# Altium footprint library PcbLibUltimate (1).pcblib: 202 footprints (part 11 of 13)
Each footprint in its own frame and in the unit in brackets; x right, y up, seen from the top. Pads: shape width x height; smd on the part's side, far side on the other; paste and mask are expansions set on the pad; w line width, h text height; cw(c..) or ccw(c..) is an arc to the next point about the centre after c.
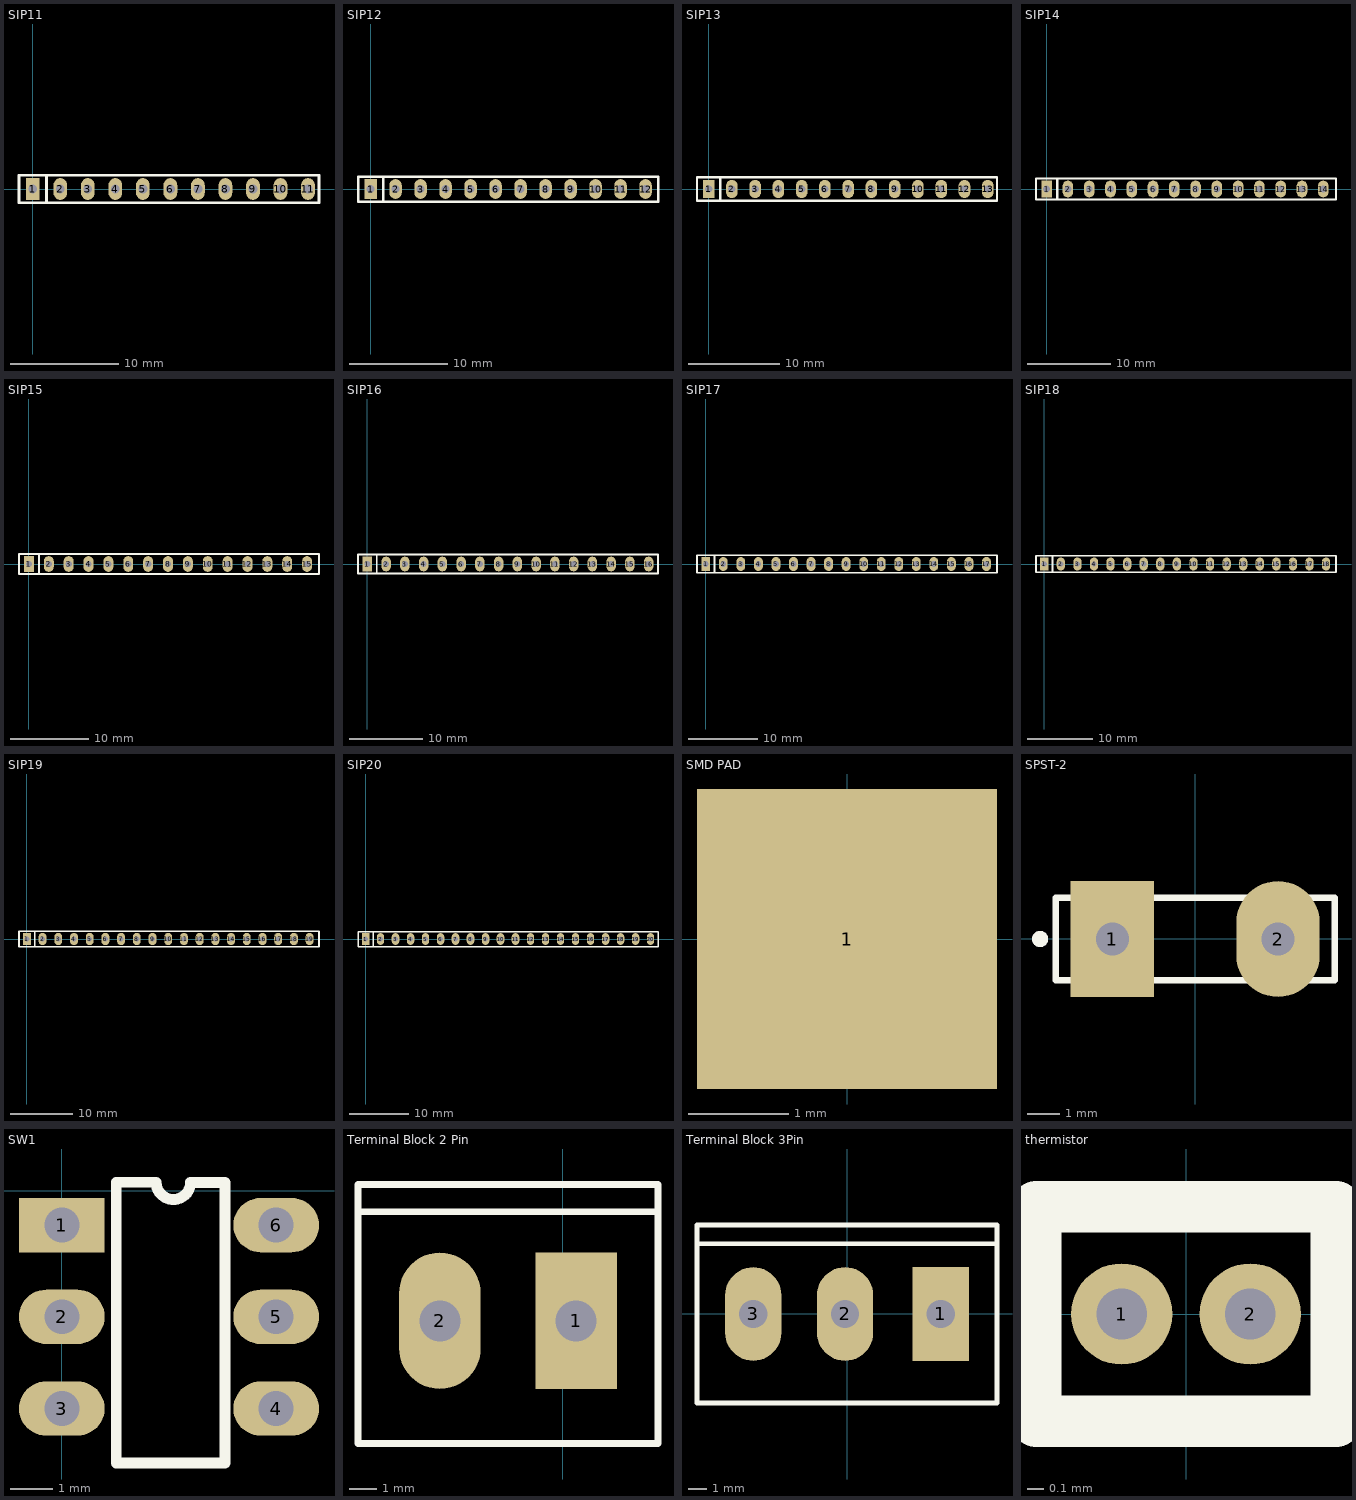
[diagram p10: the footprints below, top view; thin cyan lines are the x and y axes]

## SIP11 [mil]
pads (11):
  rect 50x78.74 hole 32: 1(0,0)
  oval 50x78.74 hole 32: 2(100,0) 3(200,0) 4(300,0) 5(400,0) 6(500,0) 7(600,0) 8(700,0) 9(800,0) 10(900,0) 11(1000,0)
Top Overlay:
  lines w10: 50,-50 50,50 ; -50,-50 1040,-50 1040,50 -50,50 -50,-50

## SIP12 [mil]
pads (12):
  rect 50x78.74 hole 32: 1(0,0)
  oval 50x78.74 hole 32: 2(100,0) 3(200,0) 4(300,0) 5(400,0) 6(500,0) 7(600,0) 8(700,0) 9(800,0) 10(900,0) 11(1000,0) 12(1100,0)
Top Overlay:
  lines w10: 50,-50 50,50 ; -50,-50 -50,50 1150,50 1150,-50 -50,-50

## SIP13 [mil]
pads (13):
  rect 50x78.74 hole 32: 1(0,0)
  oval 50x78.74 hole 32: 2(100,0) 3(200,0) 4(300,0) 5(400,0) 6(500,0) 7(600,0) 8(700,0) 9(800,0) 10(900,0) 11(1000,0) 12(1100,0) 13(1200,0)
Top Overlay:
  lines w10: 50,-50 50,50 ; -50,-50 -50,50 1240,50 1240,-50 -50,-50

## SIP14 [mil]
pads (14):
  rect 50x78.74 hole 32: 1(0,0)
  oval 50x78.74 hole 32: 2(100,0) 3(200,0) 4(300,0) 5(400,0) 6(500,0) 7(600,0) 8(700,0) 9(800,0) 10(900,0) 11(1000,0) 12(1100,0) 13(1200,0) 14(1300,0)
Top Overlay:
  lines w10: 50,-50 50,50 ; -50,-50 -50,50 1360,50 1360,-50 -50,-50

## SIP15 [mil]
pads (15):
  rect 50x78.74 hole 32: 1(0,0)
  oval 50x78.74 hole 32: 2(100,0) 3(200,0) 4(300,0) 5(400,0) 6(500,0) 7(600,0) 8(700,0) 9(800,0) 10(900,0) 11(1000,0) 12(1100,0) 13(1200,0) 14(1300,0) 15(1400,0)
Top Overlay:
  lines w10: 50,-50 50,50 ; -50,-50 -50,50 1460,50 1460,-50 -50,-50

## SIP16 [mil]
pads (16):
  rect 50x78.74 hole 32: 1(0,0)
  oval 50x78.74 hole 32: 2(100,0) 3(200,0) 4(300,0) 5(400,0) 6(500,0) 7(600,0) 8(700,0) 9(800,0) 10(900,0) 11(1000,0) 12(1100,0) 13(1200,0) 14(1300,0) 15(1400,0) 16(1500,0)
Top Overlay:
  lines w10: 50,-50 50,50 ; -50,-50 1550,-50 1550,50 -50,50 -50,-50

## SIP17 [mil]
pads (17):
  rect 50x78.74 hole 32: 1(0,0)
  oval 50x78.74 hole 32: 2(100,0) 3(200,0) 4(300,0) 5(400,0) 6(500,0) 7(600,0) 8(700,0) 9(800,0) 10(900,0) 11(1000,0) 12(1100,0) 13(1200,0) 14(1300,0) 15(1400,0) 16(1500,0) 17(1600,0)
Top Overlay:
  lines w10: 50,-50 50,50 ; -50,-50 -50,50 1660,50 1660,-50 -50,-50

## SIP18 [mil]
pads (18):
  rect 50x78.74 hole 32: 1(0,0)
  oval 50x78.74 hole 32: 2(100,0) 3(200,0) 4(300,0) 5(400,0) 6(500,0) 7(600,0) 8(700,0) 9(800,0) 10(900,0) 11(1000,0) 12(1100,0) 13(1200,0) 14(1300,0) 15(1400,0) 16(1500,0) 17(1600,0) 18(1700,0)
Top Overlay:
  lines w10: 50,-50 50,50 ; -50,-50 1760,-50 1760,50 -50,50 -50,-50

## SIP19 [mil]
pads (19):
  rect 50x78.74 hole 32: 1(0,0)
  oval 50x78.74 hole 32: 2(100,0) 3(200,0) 4(300,0) 5(400,0) 6(500,0) 7(600,0) 8(700,0) 9(800,0) 10(900,0) 11(1000,0) 12(1100,0) 13(1200,0) 14(1300,0) 15(1400,0) 16(1500,0) 17(1600,0) 18(1700,0) 19(1800,0)
Top Overlay:
  lines w10: 50,-50 50,50 ; -50,-50 -50,50 1860,50 1860,-50 -50,-50

## SIP20 [mil]
pads (20):
  rect 50x78.74 hole 32: 1(0,0)
  oval 50x78.74 hole 32: 2(100,0) 3(200,0) 4(300,0) 5(400,0) 6(500,0) 7(600,0) 8(700,0) 9(800,0) 10(900,0) 11(1000,0) 12(1100,0) 13(1200,0) 14(1300,0) 15(1400,0) 16(1500,0) 17(1600,0) 18(1700,0) 19(1800,0) 20(1900,0)
Top Overlay:
  lines w10: 50,-50 50,50 ; -50,-50 -50,50 1950,50 1950,-50 -50,-50

## SMD PAD [mm]
pads (1):
  rect 3x3 smd: 1(0,0)

## SPST-2 [mm] "Switch; 2 Leads"
pads (2):
  rect 2.561x3.559 hole 1: 1(-2.54,0)
  oval 2.561x3.559 hole 1: 2(2.54,0)
Top Overlay:
  circle w0.25: c-4.761,-0.001 r0.125
  lines w0.2: -4.28,-1.27 -4.28,1.27 4.28,1.27 4.28,-1.27 -4.28,-1.27

## SW1 [mm]
pads (6):
  rect 2x1.27 hole 0.813: 1(0,-0.8)
  oval 2x1.27 hole 0.813: 2(0,-2.94) 3(0,-5.08) 4(5,-5.08) 5(5,-2.94) 6(5,-0.8)
Top Overlay:
  lines w0.254: 3.003,0.2 cw(c2.602,0.2) 2.2,0.2 1.27,0.2 1.27,-6.35 3.81,-6.35 3.81,0.193 3.01,0.193

## Terminal Block 2 Pin [mm]
pads (2):
  rect 3x5 hole 1.5: 1(0.5,12.5)
  oval 3x5 hole 1.5: 2(-4.5,12.5)
Top Overlay:
  lines w0.254: -7.5,16.5 3.5,16.5 ; -7.5,8 -7.5,17.5 3.5,17.5 3.5,8 -7.5,8
3D body "c-282837-2-g2-3d.stp": height 10.25, standoff -3.25, extent -7.08,8.3 3.68,16.5

## Terminal Block 3Pin [mm]
pads (3):
  rect 3x5 hole 1.5: 1(5,0)
  oval 3x5 hole 1.5: 2(-0.1,0) 3(-5,0)
Top Overlay:
  lines w0.254: -8,3.75 8,3.75 ; -8,-4.75 -8,4.75 8,4.75 8,-4.75 -8,-4.75
3D body "c-282836-3-h-3d.stp": height 10, standoff -3.5, extent -7.75,-4.45 7.85,3.75

## thermistor [mm]
pads (2):
  round 0.6 hole 0.3 mask+0.102: 1(-0.381,0) 2(0.381,0)
Top Overlay:
  lines w0.305: -0.889,-0.635 0.889,-0.635 0.889,0.635 -0.889,0.635 -0.889,-0.635
Mechanical 2:
  lines w0.254: -0.889,-0.635 -0.889,0.635 0.889,0.635 0.889,-0.635 -0.889,-0.635
Mechanical 29:
  text "'.Designator'" at 5.524,-1.27 h1.52
3D body "Thermistor_NTC-Micro-Chip-Insulated.step": height 40, standoff -1, extent -0.79,-0.802 0.792,0.803